# Altium footprint library PHOENIX THD.PcbLib: 109 footprints (part 8 of 8)
Each footprint in its own frame and in the unit in brackets; x right, y up, seen from the top. Pads: shape width x height; smd on the part's side, far side on the other; paste and mask are expansions set on the pad; w line width, h text height; cw(c..) or ccw(c..) is an arc to the next point about the centre after c.
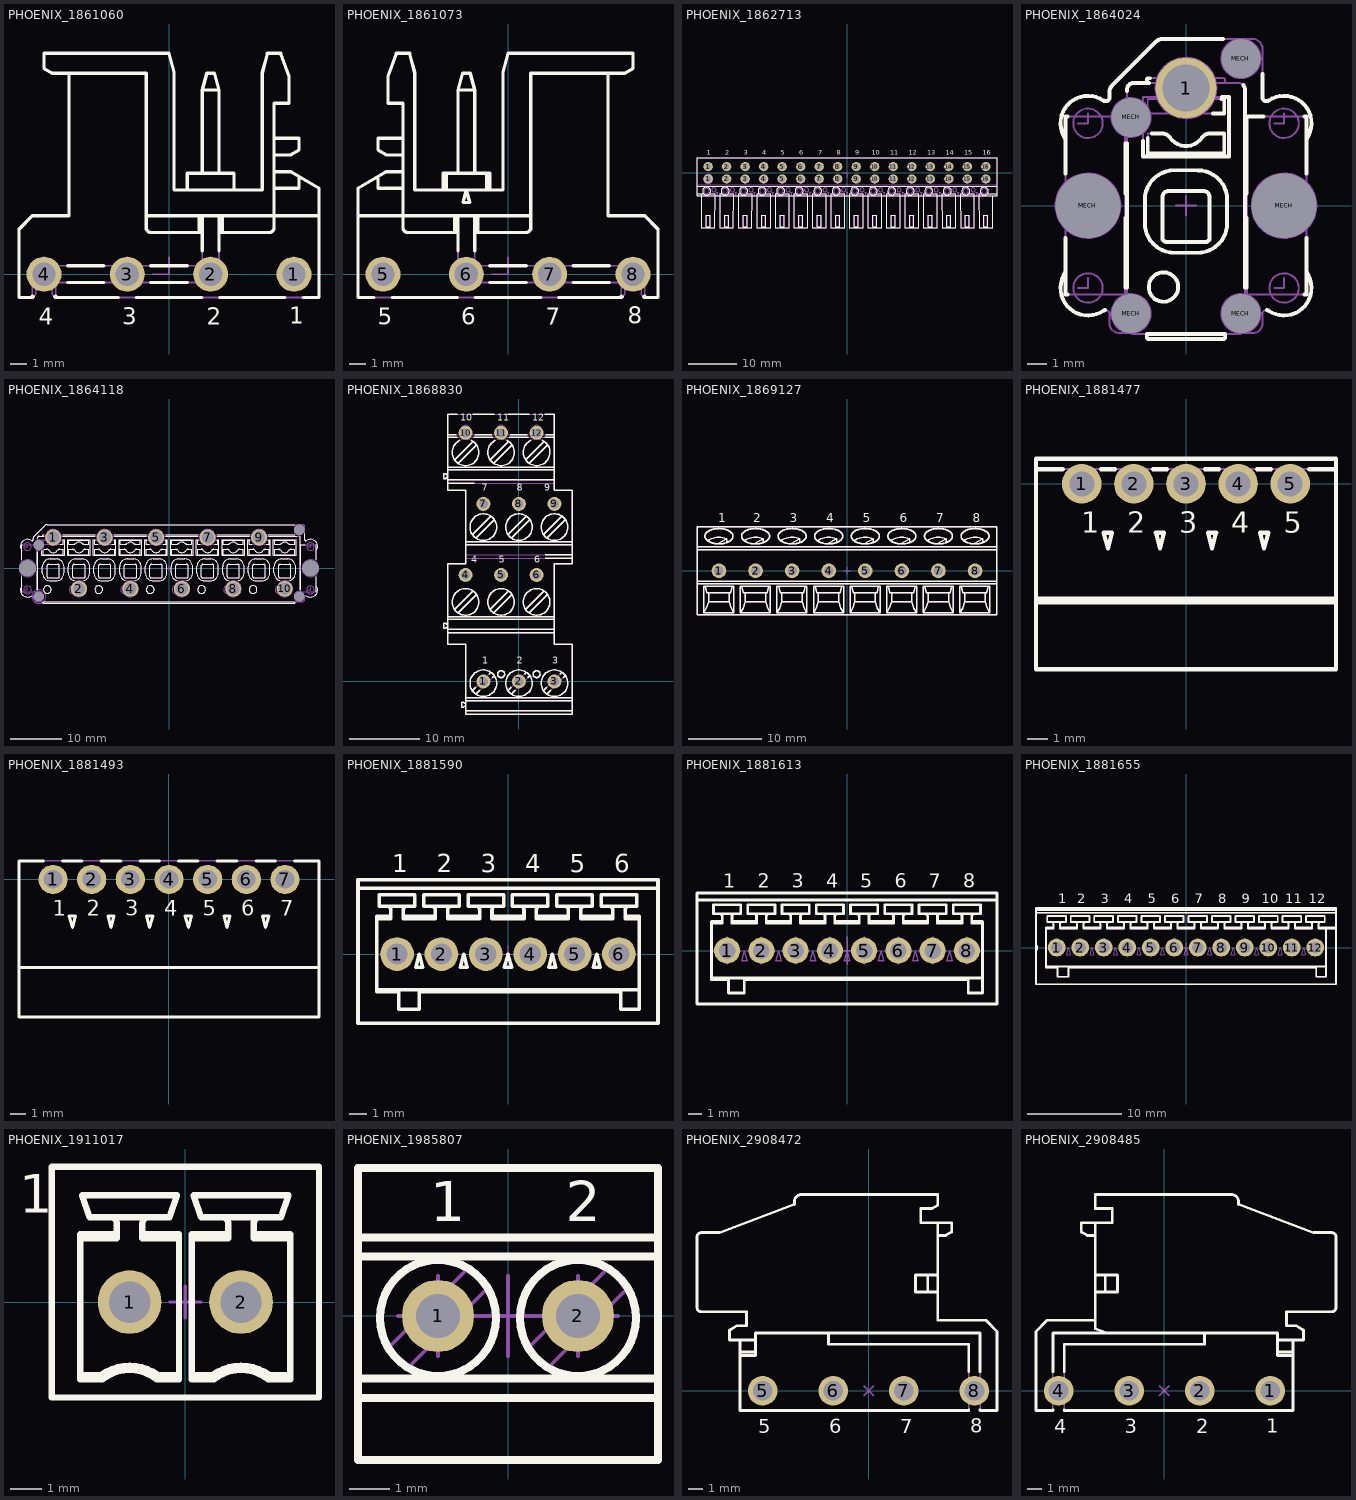
[diagram p7: the footprints below, top view; thin cyan lines are the x and y axes]

## PHOENIX_1861060 [mm] "COMBICON PCB Male Header, Pitch 5mm, 4 Positions, Left"
height 16
pads (4):
  round 2.1 hole 1.4: 1(7.5,0) 2(2.5,0) 3(-2.5,0) 4(-7.5,0)
Top Overlay:
  lines w0.2: -8.2,-1.327 -8.2,-1.4 ; -8.151,-1.351 -8.2,-1.4 ; -6.849,-1.351 -6.8,-1.4 ; -6.8,-1.327 -6.8,-1.4 ; -6.086,-0.5 -3.914,-0.5 ; -6.086,0.5 -3.914,0.5 ; -6,12.05 -6,3.5 -8.2,3.5 -9,2.7 -9,-1.4 -8.2,-1.4 ; -3.039,-1.4 -6.8,-1.4 ; -1.961,-1.4 1.961,-1.4 ; -1.37,3.5 9,3.5 ; -1.086,-0.5 1.086,-0.5 ; -1.086,0.5 1.086,0.5 ; 1.1,5.05 1.1,6.05 3.9,6.05 3.9,5.05 ; 1.8,3.5 1.8,2.5 2,2.7 ; 2,1.414 2,3.5 ; 2,2.5 -1.07,2.5 cw(c-1.07,2.8) -1.37,2.8 -1.37,12.05 -6.98,12.05 -7.5,12.35 -7.5,13.25 0,13.25 0.3,12.13 0.3,5.05 5.593,5.05 5.593,12.087 5.905,13.25 6.7,13.25 7.2,11.876 7.2,10.25 6.3,10.25 6.3,2.8 cw(c6,2.8) 6,2.5 3,2.5 ; 2,6.05 2,11.05 ; 3,1.414 3,3.5 ; 3,2.7 3.2,2.5 3.2,3.5 ; 3,6.05 3,11.05 ; 3.039,-1.4 6.961,-1.4 ; 6.3,5.15 7.8,5.15 7.8,5.85 ; 6.3,6.15 7.28,6.15 9,5.157 9,-1.4 8.039,-1.4 ; 6.3,7.15 7.28,7.15 7.8,7.45 7.8,8.15 6.3,8.15 ; 2,11.05 2.268,12.05 2.732,12.05 3,11.05 ; 2,11.05 3,11.05
  text "1" at 7.2,-2.972 h1
  text "4" at -7.825,-3.025 h1
  text "3" at -2.8,-3.025 h1
  text "2" at 2.25,-3.025 h1
Mechanical 8:
  lines w0.1: -8.5,0 -7.5,0 -7.5,1 ; -3.5,0 -2.5,0 -2.5,1 ; -1,0 0,0 0,1 ; 1.5,0 2.5,0 2.5,1 ; 6.5,0 7.5,0 7.5,1
Mechanical 14:
  lines w0.1: -8,-0.5 1.8,-0.5 ccw(c1.8,0.7) 3,0.7 3,3.5 ; -7,-0.5 -7,-1.2 -6.8,-1.4 ; -7,0.5 -6.8,0.7 ; -6.8,-0.5 -6.8,-1.4 ; -6.8,0.5 -6.8,0.7 ; -6,12.05 -6,3.5 -8.2,3.5 -9,2.7 -9,-1.4 -8.2,-1.4 ; -1.37,3.5 9,3.5 ; 1.1,5.05 1.1,6.05 3.9,6.05 3.9,5.05 ; 1.8,3.5 1.8,2.5 2,2.7 ; 2,2.5 -1.07,2.5 cw(c-1.07,2.8) -1.37,2.8 -1.37,12.05 -6.98,12.05 -7.5,12.35 -7.5,13.25 0,13.25 0.3,12.13 0.3,5.05 5.593,5.05 5.593,12.087 5.905,13.25 6.7,13.25 7.2,11.876 7.2,10.25 6.3,10.25 6.3,2.8 cw(c6,2.8) 6,2.5 3,2.5 ; 2,3.5 2,0.7 cw(c1.8,0.7) 1.8,0.5 -8,0.5 ; 2,6.05 2,11.05 ; 3,2.7 3.2,2.5 3.2,3.5 ; 3,6.05 3,11.05 ; 6.3,5.15 7.8,5.15 7.8,5.85 ; 6.3,6.15 7.28,6.15 9,5.157 9,-1.4 -6.8,-1.4 ; 6.3,7.15 7.28,7.15 7.8,7.45 7.8,8.15 6.3,8.15 ; -8.2,-1.4 -8.2,0.7 ; -8.2,-1.4 -8,-1.2 -8,0.5 ; -8.2,0.7 -8,0.5 ; -8.2,0.7 -6.8,0.7 ; 2,11.05 2.268,12.05 2.732,12.05 3,11.05 ; 2,11.05 3,11.05
  text "2" at 2.25,-3.025 h1
  text "3" at -2.8,-3.025 h1
  text "4" at -7.825,-3.025 h1
  text "1" at 7.2,-2.972 h1
3D body "PHOENIX_1861060.stp": height 15.97, standoff -3.98, extent -9,-1.4 9,13.25

## PHOENIX_1861073 [mm] "COMBICON PCB Male Header, Pitch 5mm, 4 Positions, Right"
height 16
pads (4):
  round 2.1 hole 1.4: 5(-7.5,0) 6(-2.5,0) 7(2.5,0) 8(7.5,0)
Top Overlay:
  lines w0.2: -9,3.5 1.37,3.5 ; -8.039,-1.4 -9,-1.4 -9,5.157 -7.28,6.15 -6.3,6.15 ; -7.8,5.85 -7.8,5.15 -6.3,5.15 ; -6.961,-1.4 -3.039,-1.4 ; -6.3,7.15 -7.28,7.15 -7.8,7.45 -7.8,8.15 -6.3,8.15 ; -3.9,5.05 -3.9,6.05 -1.1,6.05 -1.1,5.05 ; -3.712,5.05 -3.712,6.05 ; -3.2,3.5 -3.2,2.5 -3,2.7 ; -3,1.414 -3,3.5 ; -3,2.5 -6,2.5 cw(c-6,2.8) -6.3,2.8 -6.3,10.25 -7.2,10.25 -7.2,11.876 -6.7,13.25 -5.905,13.25 -5.593,12.087 -5.593,5.05 -0.3,5.05 -0.3,12.13 0,13.25 7.5,13.25 7.5,12.35 6.98,12.05 1.37,12.05 1.37,2.8 cw(c1.07,2.8) 1.07,2.5 -2,2.5 ; -3,6.05 -3,11.05 ; -2,1.414 -2,3.5 ; -2,2.7 -1.8,2.5 -1.8,3.5 ; -2,6.05 -2,11.05 ; -1.961,-1.4 1.961,-1.4 ; -1.288,5.05 -1.288,6.05 ; -1.086,-0.5 1.086,-0.5 ; -1.086,0.5 1.086,0.5 ; 3.039,-1.4 6.8,-1.4 ; 3.914,-0.5 6.086,-0.5 ; 3.914,0.5 6.086,0.5 ; 6,12.05 6,3.5 8.2,3.5 9,2.7 9,-1.4 8.2,-1.4 ; 6.8,-1.327 6.8,-1.4 ; 6.849,-1.351 6.8,-1.4 ; 8.151,-1.351 8.2,-1.4 ; 8.2,-1.327 8.2,-1.4 ; -3,11.05 -2.732,12.05 -2.268,12.05 -2,11.05 ; -3,11.05 -2,11.05 ; -2.701,4.3 -2.5,5.05 -2.299,4.3 -2.701,4.3
  text "7" at 2.25,-3.025 h1
  text "6" at -2.8,-3.025 h1
  text "5" at -7.825,-3.025 h1
  text "8" at 7.2,-2.972 h1
Mechanical 8:
  lines w0.1: -8.5,0 -7.5,0 -7.5,-1 ; -3.5,0 -2.5,0 -2.5,-1 ; -1,0 0,0 0,1 ; 1.5,0 2.5,0 2.5,-1 ; 6.5,0 7.5,0 7.5,-1
Mechanical 14:
  lines w0.1: -9,3.5 1.37,3.5 ; -7.8,5.85 -7.8,5.15 -6.3,5.15 ; -6.3,6.15 -7.28,6.15 -9,5.157 -9,-1.4 6.8,-1.4 ; -6.3,7.15 -7.28,7.15 -7.8,7.45 -7.8,8.15 -6.3,8.15 ; -3.9,5.05 -3.9,6.05 -1.1,6.05 -1.1,5.05 ; -3.712,5.05 -3.712,6.05 ; -3.2,3.5 -3.2,2.5 -3,2.7 ; -3,2.5 -6,2.5 cw(c-6,2.8) -6.3,2.8 -6.3,10.25 -7.2,10.25 -7.2,11.876 -6.7,13.25 -5.905,13.25 -5.593,12.087 -5.593,5.05 -0.3,5.05 -0.3,12.13 0,13.25 7.5,13.25 7.5,12.35 6.98,12.05 1.37,12.05 1.37,2.8 cw(c1.07,2.8) 1.07,2.5 -2,2.5 ; -3,3.5 -3,0.7 ccw(c-1.8,0.7) -1.8,-0.5 8,-0.5 ; -3,6.05 -3,11.05 ; -2,2.7 -1.8,2.5 -1.8,3.5 ; -2,3.5 -2,0.7 ccw(c-1.8,0.7) -1.8,0.5 8,0.5 ; -2,6.05 -2,11.05 ; -1.288,5.05 -1.288,6.05 ; 6,12.05 6,3.5 8.2,3.5 9,2.7 9,-1.4 8.2,-1.4 ; 6.8,-0.5 6.8,-1.4 ; 6.8,0.5 6.8,0.7 ; 7,-0.5 7,-1.2 6.8,-1.4 ; 7,0.5 6.8,0.7 ; -3,11.05 -2.732,12.05 -2.268,12.05 -2,11.05 ; -3,11.05 -2,11.05 ; 6.8,0.7 8.2,0.7 ; 8,0.5 8,-1.2 8.2,-1.4 ; 8,0.5 8.2,0.7 ; 8.2,-1.4 8.2,0.7 ; -2.701,4.3 -2.5,5.05 -2.299,4.3 -2.701,4.3
  text "8" at 7.2,-2.972 h1
  text "5" at -7.825,-3.025 h1
  text "6" at -2.8,-3.025 h1
  text "7" at 2.25,-3.025 h1
3D body "PHOENIX_1861073.stp": height 15.97, standoff -3.98, extent -9,-1.4 9,13.25

## PHOENIX_1862713 [mm] "PHOENIX IMC Series, Pitch 3.81mm, 8A, 160V, 16 Positions Header"
height 6.85
pads (32):
  round 1.9 hole 1.2: 1(-28.575,-1.27) 1(-28.575,1.27) 2(-24.765,-1.27) 2(-24.765,1.27) 3(-20.955,-1.27) 3(-20.955,1.27) 4(-17.145,-1.27) 4(-17.145,1.27) 5(-13.335,-1.27) 5(-13.335,1.27) 6(-9.525,-1.27) 6(-9.525,1.27) 7(-5.715,-1.27) 7(-5.715,1.27) 8(-1.905,-1.27) 8(-1.905,1.27) 9(1.905,-1.27) 9(1.905,1.27) 10(5.715,-1.27) 10(5.715,1.27) 11(9.525,-1.27) 11(9.525,1.27) 12(13.335,-1.27) 12(13.335,1.27) 13(17.145,-1.27) 13(17.145,1.27) 14(20.955,-1.27) 14(20.955,1.27) 15(24.765,-1.27) 15(24.765,1.27) 16(28.575,-1.27) 16(28.575,1.27)
Top Overlay:
  drawing of 165 lines, arcs and shapes, not listed
  text "12" at 12.7,3.683 h1
  text "11" at 8.89,3.683 h1
  text "3" at -21.209,3.683 h1
  text "2" at -25.019,3.683 h1
  text "1" at -28.829,3.683 h1
  text "4" at -17.399,3.683 h1
  text "7" at -5.969,3.683 h1
  text "6" at -9.779,3.683 h1
  text "5" at -13.589,3.683 h1
  text "8" at -2.159,3.683 h1
  text "9" at 1.651,3.683 h1
  text "10" at 5.08,3.683 h1
  text "13" at 16.51,3.683 h1
  text "14" at 20.32,3.683 h1
  text "15" at 24.13,3.683 h1
  text "16" at 27.94,3.683 h1
Mechanical 8:
  circle w0.1: c-28.575,-1.27 r0.6
  circle w0.1: c-28.575,-1.27 r0.95
  lines w0.1: -29.575,-1.27 -28.575,-1.27 -28.575,-2.27 ; -29.575,1.27 -28.575,1.27 -28.575,0.27 ; -25.765,-1.27 -24.765,-1.27 -24.765,-2.27 ; -25.765,1.27 -24.765,1.27 -24.765,0.27 ; -21.955,-1.27 -20.955,-1.27 -20.955,-2.27 ; -21.955,1.27 -20.955,1.27 -20.955,0.27 ; -18.145,-1.27 -17.145,-1.27 -17.145,-2.27 ; -18.145,1.27 -17.145,1.27 -17.145,0.27 ; -14.335,-1.27 -13.335,-1.27 -13.335,-2.27 ; -14.335,1.27 -13.335,1.27 -13.335,0.27 ; -10.525,-1.27 -9.525,-1.27 -9.525,-2.27 ; -10.525,1.27 -9.525,1.27 -9.525,0.27 ; -6.715,-1.27 -5.715,-1.27 -5.715,-2.27 ; -6.715,1.27 -5.715,1.27 -5.715,0.27 ; -2.905,-1.27 -1.905,-1.27 -1.905,-2.27 ; -2.905,1.27 -1.905,1.27 -1.905,0.27 ; -1,0 0,0 0,-1 ; 0.905,-1.27 1.905,-1.27 1.905,-2.27 ; 0.905,1.27 1.905,1.27 1.905,0.27 ; 4.715,-1.27 5.715,-1.27 5.715,-2.27 ; 4.715,1.27 5.715,1.27 5.715,0.27 ; 8.525,-1.27 9.525,-1.27 9.525,-2.27 ; 8.525,1.27 9.525,1.27 9.525,0.27 ; 12.335,-1.27 13.335,-1.27 13.335,-2.27 ; 12.335,1.27 13.335,1.27 13.335,0.27 ; 16.145,-1.27 17.145,-1.27 17.145,-2.27 ; 16.145,1.27 17.145,1.27 17.145,0.27 ; 19.955,-1.27 20.955,-1.27 20.955,-2.27 ; 19.955,1.27 20.955,1.27 20.955,0.27 ; 23.765,-1.27 24.765,-1.27 24.765,-2.27 ; 23.765,1.27 24.765,1.27 24.765,0.27 ; 27.575,-1.27 28.575,-1.27 28.575,-2.27 ; 27.575,1.27 28.575,1.27 28.575,0.27
Mechanical 14:
  drawing of 274 lines, arcs and shapes, not listed
3D body "PHOENIX_1862713.stp": height 6.85, standoff -3.4, extent -30.875,-11.37 30.875,3.13

## PHOENIX_1864024 [mm] "12A, 320V, SKEDD Direct Plug-in Technology Terminal Block, Pitch 5mm, 1 Position (Push-in Spring Connection)"
height 16.35
pads (7):
  round 3.1 hole 2.4: 1(0,6)
  round 1 hole 3.3 unplated mask+1.15: MECH(-5,0) MECH(5,0)
  round 1 hole 2 unplated mask+0.5: MECH(-2.8,-5.5) MECH(-2.8,4.5) MECH(2.8,-5.5) MECH(2.8,7.5)
Top Overlay:
  circle w0.2: c-1.15,-4.15 r0.75
  lines w0.2: -6.15,-3.402 ccw(c-5,-4.2) -4.212,-5.358 cw(c-4.1,-5.523) -4.139,-5.327 ; -6.15,-1.636 -6.15,-4.54 -6.046,-4.54 ; -6.15,1.636 -6.15,4.54 -6.046,4.54 ; -6.15,3.402 cw(c-5,4.2) -4.212,5.358 ccw(c-4.1,5.523) -3.9,5.523 -3.9,5.793 cw(c-3.4,5.793) -3.754,6.146 -1.546,8.354 cw(c-1.193,8) -1.193,8.5 1.893,8.5 ; -3.1,-4.184 -3.1,-0.624 ; -3.1,0.624 -3.1,3.184 ; -3,-4.165 -3,3.165 ; -3,5.835 -3,5.95 cw(c-2.7,5.95) -2.7,6.25 -1.883,6.25 ; -2.2,3.291 -2.2,2.5 2.2,2.5 2.2,5.55 1.846,5.55 ; -2,-6.55 -2,-6.7 ccw(c-1.9,-6.7) -1.9,-6.8 1.9,-6.8 ccw(c1.9,-6.7) 2,-6.7 2,-6.55 ; -2,6.25 -2,6.4 cw(c-1.9,6.4) -1.9,6.5 -1.833,6.5 ; -1.951,-6.55 1.951,-6.55 ; -1.95,3.451 -1.95,2.65 1.95,2.65 1.95,3.679 1.226,3.679 ; -1.728,3.679 -1.226,3.679 ; -1.228,3.679 cw(c-1.228,3.179) -0.82,3.468 ccw(c0,4.05) 0.82,3.468 cw(c1.228,3.179) 1.228,3.679 ; 1.386,4.7 1.95,4.7 1.95,5.446 1.817,5.445 ; 2.919,6.155 cw(c2.7,5.95) 3,5.95 3,-4.165 ; 3.1,-4.184 3.1,-0.624 ; 3.1,0.624 3.1,4.54 3.954,4.54 ; 3.9,6.717 3.9,5.523 ccw(c4.1,5.523) 4.213,5.358 cw(c5,4.2) 6.15,3.402 ; 4.139,-5.327 cw(c4.1,-5.523) 4.213,-5.358 ccw(c5,-4.2) 6.15,-3.402 ; 6.046,-4.54 6.15,-4.54 6.15,-1.636 ; 6.046,4.54 6.15,4.54 6.15,1.636 ; -2.1,-0.9 ccw(c-0.6,-0.9) -0.6,-2.4 0.6,-2.4 ccw(c0.6,-0.9) 2.1,-0.9 2.1,0.3 ccw(c0.6,0.3) 0.606,1.8 -0.6,1.805 ccw(c-0.592,0.297) -2.1,0.3 -2.1,-0.9 ; -1.2,-1.65 ccw(c-1,-1.65) -1,-1.85 1,-1.85 ccw(c1,-1.65) 1.2,-1.65 1.2,0.45 ccw(c0.9,0.45) 0.9,0.75 -0.9,0.75 ccw(c-0.9,0.45) -1.2,0.45 -1.2,-1.65
Mechanical 8:
  circle w0.1: c-5,4.2 r0.75
  circle w0.1: c-5,-4.2 r0.75
  circle w0.1: c5,4.2 r0.75
  circle w0.1: c5,-4.2 r0.75
  circle w0.1: c-5,0 r1.65
  circle w0.1: c5,0 r1.65
  circle w0.1: c-2.8,4.5 r1
  circle w0.1: c2.8,7.5 r1
  circle w0.1: c2.8,-5.5 r1
  circle w0.1: c-2.8,-5.5 r1
  circle w0.1: c0,6 r1.2
  circle w0.1: c0,6 r1.55
  lines w0.1: -5.5,-4.2 -5,-4.2 -5,-3.7 ; -5.5,0 -5,0 ; -5.5,4.2 -5,4.2 -5,4.7 ; -5,-0.5 -5,0 ; -5,0.5 -5,0 ; -4.5,0 -5,0 ; -3.154,-5.854 -2.8,-5.5 ; -3.154,-5.146 -2.8,-5.5 ; -3.154,4.146 -2.8,4.5 ; -3.154,4.854 -2.8,4.5 ; -2.446,-5.854 -2.8,-5.5 ; -2.446,-5.146 -2.8,-5.5 ; -2.446,4.146 -2.8,4.5 ; -2.446,4.854 -2.8,4.5 ; -0.5,0 0,0 ; -0.5,6 0,6 ; 0,-0.5 0,0 ; 0,0.5 0,0 ; 0,5.5 0,6 ; 0,6.5 0,6 ; 0.5,0 0,0 ; 0.5,6 0,6 ; 2.446,-5.854 2.8,-5.5 ; 2.446,-5.146 2.8,-5.5 ; 2.446,7.146 2.8,7.5 ; 2.446,7.854 2.8,7.5 ; 3.154,-5.854 2.8,-5.5 ; 3.154,-5.146 2.8,-5.5 ; 3.154,7.146 2.8,7.5 ; 3.154,7.854 2.8,7.5 ; 4.5,-4.2 5,-4.2 5,-3.7 ; 4.5,0 5,0 ; 4.5,4.2 5,4.2 5,4.7 ; 5,-0.5 5,0 ; 5,0.5 5,0 ; 5.5,0 5,0
  text "A" at -5.2,5.55 h1
  text "B" at 2.75,3.675 h1
  text "C" at 3.375,-3.225 h1
  text "D" at -3.875,-3.375 h1
Mechanical 14:
  circle w0.1: c-1.15,-4.15 r0.75
  lines w0.1: -6.15,-3.402 ccw(c-5,-4.2) -4.212,-5.358 cw(c-4.1,-5.523) -3.9,-5.523 -3.9,-6 ccw(c-3.4,-6) -3.4,-6.5 -2.865,-6.5 ; -6.15,3.402 cw(c-5,4.2) -4.212,5.358 ccw(c-4.1,5.523) -3.9,5.523 -3.9,5.793 cw(c-3.4,5.793) -3.754,6.146 -1.546,8.354 cw(c-1.193,8) -1.193,8.5 3.4,8.5 cw(c3.4,8) 3.9,8 3.9,5.523 ccw(c4.1,5.523) 4.213,5.358 cw(c5,4.2) 6.15,3.402 ; -2,-6.55 -2,-6.7 ccw(c-1.9,-6.7) -1.9,-6.8 1.9,-6.8 ccw(c1.9,-6.7) 2,-6.7 2,-6.55 ; -2,6.25 -2,6.4 cw(c-1.9,6.4) -1.9,6.5 1.9,6.5 cw(c1.9,6.4) 2,6.4 2,6.25 ; -1.228,3.679 cw(c-1.228,3.179) -0.82,3.468 ccw(c0,4.05) 0.82,3.468 cw(c1.228,3.179) 1.228,3.679 ; -1.226,3.679 -1.95,3.679 -1.95,2.65 1.95,2.65 1.95,3.679 1.226,3.679 ; -0.895,4.7 ccw(c-0.895,5) -0.689,4.782 cw(c0,4.05) 0.689,4.782 ccw(c0.895,5) 0.895,4.7 ; -0.893,4.7 -1.95,4.7 -1.95,5.433 1.95,5.446 1.95,4.7 0.893,4.7 ; 2.864,-6.5 3.4,-6.5 ccw(c3.4,-6) 3.9,-6 3.9,-5.523 cw(c4.1,-5.523) 4.213,-5.358 ccw(c5,-4.2) 6.15,-3.402 ; -6.15,-4.54 -3.1,-4.54 -3.1,4.54 -6.15,4.54 -6.15,-4.54 ; -3,-6.25 ccw(c-2.699,-6.249) -2.7,-6.55 2.7,-6.55 ccw(c2.7,-6.25) 3,-6.25 3,5.95 ccw(c2.7,5.95) 2.7,6.25 -2.7,6.25 ccw(c-2.7,5.95) -3,5.95 -3,-6.25 ; -2.2,2.5 2.2,2.5 2.2,5.55 -2.2,5.55 -2.2,2.5 ; -2.1,-0.9 ccw(c-0.6,-0.9) -0.6,-2.4 0.6,-2.4 ccw(c0.6,-0.9) 2.1,-0.9 2.1,0.3 ccw(c0.6,0.3) 0.606,1.8 -0.6,1.805 ccw(c-0.592,0.297) -2.1,0.3 -2.1,-0.9 ; -1.2,-1.65 ccw(c-1,-1.65) -1,-1.85 1,-1.85 ccw(c1,-1.65) 1.2,-1.65 1.2,0.45 ccw(c0.9,0.45) 0.9,0.75 -0.9,0.75 ccw(c-0.9,0.45) -1.2,0.45 -1.2,-1.65 ; 3.1,-4.54 6.15,-4.54 6.15,4.54 3.1,4.54 3.1,-4.54
3D body "PHOENIX_1864024.stp": height 16.2, standoff -5, extent -6.585,-6.8 6.582,8.5

## PHOENIX_1864118 [mm] "12A, 320V, SKEDD Direct Plug-in Technology Terminal Block, Pitch 5mm, 10 Positions (Push-in Spring Connection)"
height 16.35
pads (16):
  round 3.1 hole 2.4: 1(-22.5,6) 2(-17.5,-4) 3(-12.5,6) 4(-7.5,-4) 5(-2.5,6) 6(2.5,-4) 7(7.5,6) 8(12.5,-4) 9(17.5,6) 10(22.5,-4)
  round 1 hole 3.3 unplated mask+1.15: MECH(-27.5,0) MECH(27.5,0)
  round 1 hole 2 unplated mask+0.5: MECH(-25.3,-5.5) MECH(-25.3,4.5) MECH(25.3,-5.5) MECH(25.3,7.5)
Top Overlay:
  drawing of 400 lines, arcs and shapes, not listed
Mechanical 8:
  circle w0.1: c-25.3,-5.5 r1.35
  circle w0.1: c17.5,6 r1.55
  circle w0.1: c17.5,6 r1.2
  circle w0.1: c7.5,6 r1.55
  circle w0.1: c7.5,6 r1.2
  circle w0.1: c-2.5,6 r1.55
  circle w0.1: c-2.5,6 r1.2
  circle w0.1: c-12.5,6 r1.55
  circle w0.1: c-12.5,6 r1.2
  circle w0.1: c22.5,-4 r1.55
  circle w0.1: c22.5,-4 r1.2
  circle w0.1: c12.5,-4 r1.55
  circle w0.1: c12.5,-4 r1.2
  circle w0.1: c2.5,-4 r1.55
  circle w0.1: c2.5,-4 r1.2
  circle w0.1: c-7.5,-4 r1.55
  circle w0.1: c-7.5,-4 r1.2
  circle w0.1: c-17.5,-4 r1.55
  circle w0.1: c-17.5,-4 r1.2
  circle w0.1: c-22.5,6 r1.55
  circle w0.1: c-22.5,6 r1.2
  circle w0.1: c-25.3,-5.5 r1
  circle w0.1: c25.3,-5.5 r1
  circle w0.1: c25.3,7.5 r1
  circle w0.1: c-25.3,4.5 r1
  circle w0.1: c27.5,0 r1.65
  circle w0.1: c-27.5,0 r1.65
  circle w0.1: c27.5,-4.2 r0.75
  circle w0.1: c27.5,4.2 r0.75
  circle w0.1: c-27.5,-4.2 r0.75
  circle w0.1: c-27.5,4.2 r0.75
  lines w0.1: -28,-4.2 -27.5,-4.2 -27.5,-3.7 ; -28,0 -27.5,0 ; -28,4.2 -27.5,4.2 -27.5,4.7 ; -27.5,-0.5 -27.5,0 ; -27.5,0.5 -27.5,0 ; -27,0 -27.5,0 ; -25.654,-5.854 -25.3,-5.5 ; -25.654,-5.146 -25.3,-5.5 ; -25.654,4.146 -25.3,4.5 ; -25.654,4.854 -25.3,4.5 ; -24.946,-5.854 -25.3,-5.5 ; -24.946,-5.146 -25.3,-5.5 ; -24.946,4.146 -25.3,4.5 ; -24.946,4.854 -25.3,4.5 ; -23,6 -22.5,6 ; -22.5,5.5 -22.5,6 ; -22.5,6.5 -22.5,6 ; -22,6 -22.5,6 ; -18,-4 -17.5,-4 ; -17.5,-4.5 -17.5,-4 ; -17.5,-3.5 -17.5,-4 ; -17,-4 -17.5,-4 ; -13,6 -12.5,6 ; -12.5,5.5 -12.5,6 ; -12.5,6.5 -12.5,6 ; -12,6 -12.5,6 ; -8,-4 -7.5,-4 ; -7.5,-4.5 -7.5,-4 ; -7.5,-3.5 -7.5,-4 ; -7,-4 -7.5,-4 ; -3,6 -2.5,6 ; -2.5,5.5 -2.5,6 ; -2.5,6.5 -2.5,6 ; -2,6 -2.5,6 ; -0.5,0 0,0 ; 0,-0.5 0,0 ; 0,0.5 0,0 ; 0.5,0 0,0 ; 2,-4 2.5,-4 ; 2.5,-4.5 2.5,-4 ; 2.5,-3.5 2.5,-4 ; 3,-4 2.5,-4 ; 7,6 7.5,6 ; 7.5,5.5 7.5,6 ; 7.5,6.5 7.5,6 ; 8,6 7.5,6 ; 12,-4 12.5,-4 ; 12.5,-4.5 12.5,-4 ; 12.5,-3.5 12.5,-4 ; 13,-4 12.5,-4 ; 17,6 17.5,6 ; 17.5,5.5 17.5,6 ; 17.5,6.5 17.5,6 ; 18,6 17.5,6 ; 22,-4 22.5,-4 ; 22.5,-4.5 22.5,-4 ; 22.5,-3.5 22.5,-4 ; 23,-4 22.5,-4 ; 24.946,-5.854 25.3,-5.5 ; 24.946,-5.146 25.3,-5.5 ; 24.946,7.146 25.3,7.5 ; 24.946,7.854 25.3,7.5 ; 25.654,-5.854 25.3,-5.5 ; 25.654,-5.146 25.3,-5.5 ; 25.654,7.146 25.3,7.5 ; 25.654,7.854 25.3,7.5 ; 27,-4.2 27.5,-4.2 27.5,-3.7 ; 27,0 27.5,0 ; 27,4.2 27.5,4.2 27.5,4.7 ; 27.5,-0.5 27.5,0 ; 27.5,0.5 27.5,0 ; 28,0 27.5,0
  text "A" at -27.7,5.55 h1
  text "D" at -26.375,-3.375 h1
  text "B" at 25.25,3.675 h1
  text "C" at 25.875,-3.225 h1
Mechanical 14:
  drawing of 417 lines, arcs and shapes, not listed
3D body "PHOENIX_1864118.stp": height 16.2, standoff -5, extent -29.085,-6.8 29.082,8.5

## PHOENIX_1868830 [mm] "15A, 400V, Terminal Block, Pitch 5.08mm, 4 Levels, 3 Positions, Screw Connection"
height 48
pads (12):
  round 2 hole 1.3: 1(-5.08,0) 2(0,0) 3(5.08,0) 4(-7.62,15.24) 5(-2.54,15.24) 6(2.54,15.24) 7(-5.08,25.4) 8(0,25.4) 9(5.08,25.4) 10(-7.62,35.56) 11(-2.54,35.56) 12(2.54,35.56)
Top Overlay:
  circle w0.2: c5.08,22.075 r1.9
  circle w0.2: c0,22.075 r1.9
  circle w0.2: c-5.08,22.075 r1.9
  circle w0.2: c2.54,11.375 r1.9
  circle w0.2: c-7.62,11.375 r1.9
  circle w0.2: c-2.54,11.375 r1.9
  circle w0.2: c5.08,-0.25 r1.9
  circle w0.2: c0,-0.25 r1.9
  circle w0.2: c-5.08,-0.25 r1.9
  circle w0.2: c2.54,1.05 r0.5
  circle w0.2: c-2.54,1.05 r0.5
  lines w0.2: -10.16,6.95 5.08,6.95 ; -10.16,7.45 5.08,7.45 ; -10.16,7.773 -10.289,7.773 -10.467,7.623 -10.73,7.623 -10.73,8.337 -10.467,8.337 -10.289,8.187 -10.16,8.187 ; -10.16,8.878 5.08,8.878 ; -10.16,9.267 5.08,9.267 ; -10.16,28.35 -6.4,28.35 ; -10.16,28.85 5.08,28.85 ; -10.16,29.173 -10.289,29.173 -10.467,29.023 -10.73,29.023 -10.73,29.737 -10.467,29.737 -10.289,29.587 -10.16,29.587 ; -10.16,30.277 5.08,30.277 ; -10.16,30.667 5.08,30.667 ; -10.16,34.909 -8.803,34.909 ; -10.16,35.29 -8.943,35.29 ; -9.188,10.302 -6.547,12.943 ; -9.188,31.702 -6.547,34.343 ; -8.8,38.25 -10.16,38.25 -10.16,27.35 -7.62,27.35 -7.62,16.85 -10.16,16.85 -10.16,5.35 -7.62,5.35 -7.62,-4.65 7.62,-4.65 7.62,5.35 5.08,5.35 5.08,16.85 7.62,16.85 7.62,27.35 5.08,27.35 5.08,38.25 3.7,38.25 ; -8.693,9.807 -6.052,12.448 ; -8.693,31.207 -6.052,33.848 ; -8.441,34.488 ccw(c-7.62,32.775) -6.799,34.488 ; -7.62,-4.15 7.62,-4.15 ; -7.62,-3.557 -7.749,-3.557 -7.927,-3.707 -8.19,-3.707 -8.19,-2.993 -7.927,-2.993 -7.749,-3.143 -7.62,-3.143 ; -7.62,-2.747 7.62,-2.747 ; -7.62,-2.357 7.62,-2.357 ; -7.62,19.578 7.62,19.578 ; -7.62,19.967 7.62,19.967 ; -6.648,-1.323 -6.149,-0.824 ; -6.648,21.002 -4.007,23.643 ; -6.6,38.25 -3.5,38.25 ; -6.437,34.909 -3.723,34.909 ; -6.297,35.29 -3.863,35.29 ; -6.153,-1.818 -5.586,-1.251 ; -6.153,20.507 -3.512,23.148 ; -4.256,1.069 -4.007,1.318 ; -4.108,10.302 -1.467,12.943 ; -4.108,31.702 -1.467,34.343 ; -3.829,0.506 -3.512,0.823 ; -3.613,9.807 -0.972,12.448 ; -3.613,31.207 -0.972,33.848 ; -3.361,34.488 ccw(c-2.54,32.775) -1.719,34.488 ; -1.6,38.25 1.5,38.25 ; -1.568,-1.323 -1.069,-0.824 ; -1.568,21.002 1.073,23.643 ; -1.357,34.909 1.357,34.909 ; -1.217,35.29 1.217,35.29 ; -1.073,-1.818 -0.506,-1.251 ; -1.073,20.507 1.568,23.148 ; 0.824,1.069 1.073,1.318 ; 0.972,10.302 3.613,12.943 ; 0.972,31.702 3.613,34.343 ; 1.251,0.506 1.568,0.823 ; 1.467,9.807 4.108,12.448 ; 1.467,31.207 4.108,33.848 ; 1.719,34.488 ccw(c2.54,32.775) 3.361,34.488 ; 3.512,-1.323 4.011,-0.824 ; 3.512,21.002 6.153,23.643 ; 3.723,34.909 5.08,34.909 ; 3.8,17.65 7.62,17.65 ; 3.8,18.15 7.62,18.15 ; 3.863,35.29 5.08,35.29 ; 4.007,-1.818 4.574,-1.251 ; 4.007,20.507 6.648,23.148 ; 5.904,1.069 6.153,1.318 ; 6.331,0.506 6.648,0.823
  text "1" at -5.239,2.5 h1
  text "2" at -0.318,2.5 h1
  text "3" at 4.762,2.5 h1
  text "6" at 2.222,17 h1
  text "5" at -2.857,17 h1
  text "4" at -6.779,17 h1
  text "9" at 3.662,27.25 h1
  text "8" at -0.318,27.25 h1
  text "7" at -5.339,27.25 h1
  text "12" at 1.922,37.25 h1
  text "11" at -3.057,37.25 h1
  text "10" at -8.379,37.25 h1
Mechanical 8:
  lines w0.05: -8.12,15.24 -7.62,15.24 ; -8.12,35.56 -7.62,35.56 ; -7.62,14.74 -7.62,15.24 ; -7.62,15.74 -7.62,15.24 ; -7.62,35.06 -7.62,35.56 ; -7.62,36.06 -7.62,35.56 ; -7.12,15.24 -7.62,15.24 ; -7.12,35.56 -7.62,35.56 ; -5.58,0 -5.08,0 ; -5.58,25.4 -5.08,25.4 ; -5.08,-0.5 -5.08,0 ; -5.08,0.5 -5.08,0 ; -5.08,24.9 -5.08,25.4 ; -5.08,25.9 -5.08,25.4 ; -4.58,0 -5.08,0 ; -4.58,25.4 -5.08,25.4 ; -3.04,15.24 -2.54,15.24 ; -3.04,35.56 -2.54,35.56 ; -2.54,14.74 -2.54,15.24 ; -2.54,15.74 -2.54,15.24 ; -2.54,35.06 -2.54,35.56 ; -2.54,36.06 -2.54,35.56 ; -2.04,15.24 -2.54,15.24 ; -2.04,35.56 -2.54,35.56 ; -0.5,0 0,0 ; -0.5,25.4 0,25.4 ; 0,-0.5 0,0 ; 0,0.5 0,0 ; 0,24.9 0,25.4 ; 0,25.9 0,25.4 ; 0.5,0 0,0 ; 0.5,25.4 0,25.4 ; 2.04,15.24 2.54,15.24 ; 2.04,35.56 2.54,35.56 ; 2.54,14.74 2.54,15.24 ; 2.54,15.74 2.54,15.24 ; 2.54,35.06 2.54,35.56 ; 2.54,36.06 2.54,35.56 ; 3.04,15.24 2.54,15.24 ; 3.04,35.56 2.54,35.56 ; 4.58,0 5.08,0 ; 4.58,25.4 5.08,25.4 ; 5.08,-0.5 5.08,0 ; 5.08,0.5 5.08,0 ; 5.08,24.9 5.08,25.4 ; 5.08,25.9 5.08,25.4 ; 5.58,0 5.08,0 ; 5.58,25.4 5.08,25.4
Mechanical 14:
  circle w0.1: c2.54,36.15 r0.5
  circle w0.1: c-2.54,36.15 r0.5
  circle w0.1: c-7.62,36.15 r0.5
  circle w0.1: c2.54,32.775 r1.9
  circle w0.1: c-2.54,32.775 r1.9
  circle w0.1: c-7.62,32.775 r1.9
  circle w0.1: c5.08,22.075 r1.9
  circle w0.1: c0,22.075 r1.9
  circle w0.1: c-5.08,22.075 r1.9
  circle w0.1: c2.54,11.375 r1.9
  circle w0.1: c-7.62,11.375 r1.9
  circle w0.1: c-2.54,11.375 r1.9
  circle w0.1: c5.08,-0.25 r1.9
  circle w0.1: c0,-0.25 r1.9
  circle w0.1: c-5.08,-0.25 r1.9
  circle w0.1: c2.54,1.05 r0.5
  circle w0.1: c-2.54,1.05 r0.5
  lines w0.1: -10.16,6.95 5.08,6.95 ; -10.16,7.45 5.08,7.45 ; -10.16,7.773 -10.289,7.773 -10.467,7.623 -10.73,7.623 -10.73,8.337 -10.467,8.337 -10.289,8.187 -10.16,8.187 ; -10.16,8.878 5.08,8.878 ; -10.16,9.267 5.08,9.267 ; -10.16,28.35 5.08,28.35 ; -10.16,28.85 5.08,28.85 ; -10.16,29.173 -10.289,29.173 -10.467,29.023 -10.73,29.023 -10.73,29.737 -10.467,29.737 -10.289,29.587 -10.16,29.587 ; -10.16,30.277 5.08,30.277 ; -10.16,30.667 5.08,30.667 ; -10.16,34.909 5.08,34.909 ; -10.16,35.29 5.08,35.29 ; -9.188,10.302 -6.547,12.943 ; -9.188,31.702 -6.547,34.343 ; -8.693,9.807 -6.052,12.448 ; -8.693,31.207 -6.052,33.848 ; -7.62,-4.15 7.62,-4.15 ; -7.62,-3.557 -7.749,-3.557 -7.927,-3.707 -8.19,-3.707 -8.19,-2.993 -7.927,-2.993 -7.749,-3.143 -7.62,-3.143 ; -7.62,-2.747 7.62,-2.747 ; -7.62,-2.357 7.62,-2.357 ; -7.62,17.65 7.62,17.65 ; -7.62,18.15 7.62,18.15 ; -7.62,19.578 7.62,19.578 ; -7.62,19.967 7.62,19.967 ; -6.648,-1.323 -4.007,1.318 ; -6.648,21.002 -4.007,23.643 ; -6.153,-1.818 -3.512,0.823 ; -6.153,20.507 -3.512,23.148 ; -4.108,10.302 -1.467,12.943 ; -4.108,31.702 -1.467,34.343 ; -3.613,9.807 -0.972,12.448 ; -3.613,31.207 -0.972,33.848 ; -1.568,-1.323 1.073,1.318 ; -1.568,21.002 1.073,23.643 ; -1.073,-1.818 1.568,0.823 ; -1.073,20.507 1.568,23.148 ; 0.972,10.302 3.613,12.943 ; 0.972,31.702 3.613,34.343 ; 1.467,9.807 4.108,12.448 ; 1.467,31.207 4.108,33.848 ; 3.512,-1.323 6.153,1.318 ; 3.512,21.002 6.153,23.643 ; 4.007,-1.818 6.648,0.823 ; 4.007,20.507 6.648,23.148 ; -10.16,5.35 -10.16,16.85 -7.62,16.85 -7.62,27.35 -10.16,27.35 -10.16,38.25 5.08,38.25 5.08,27.35 7.62,27.35 7.62,16.85 5.08,16.85 5.08,5.35 7.62,5.35 7.62,-4.65 -7.62,-4.65 -7.62,5.35 -10.16,5.35